# Altium schematic symbol library TI Power Management Shunt Voltage Reference.SchLib: 1526 symbols (part 16 of 18) (continued)
## TLVH431BCDBVTE4
designator U?
Low-Voltage Adjustable Precision Shunt Regulator, 80 mA, 0 to 70 degC, 5-pin SOT-23 (DBV), Green (RoHS & no Sb/Br); Manufacturer: Texas Instruments; PartNumber: TLVH431BCDBVTE4; Initial Accuracy @ 25/deg C(%): 0.5; Iout/Iz(Max)(mA): 80; Rating: Catalog; SubFamily: Shunt Voltage Reference; Temp Coeff(Max)(ppm/ degree C): 129; VO Adj(Max)(V): 18; VO Adj(Min)(V): 1.24; DatasheetVersion: SLVS555I; PackageVersion: 4073253-4/K; PackageReference: DBV5; PackageDescription: 5-Pin Plastic Small Outline, Body 1.60 ?2.90 mm, Pitch 0.95 mm; Supplier 1: Digi-Key; Supplier Part Number 1: TLVH431BCDBVTE4-ND; Supplier 2: Mouser; Supplier Part Number 2: 595-TLVH431BCDBVTE4; Eco-Plan: Green (RoHS & no Sb/Br); Min Iz for Regulation(uA): 80; Mounting Technology: Surface Mount; Code_JEDEC: MO-178; ComponentLink1Description: Manufacturer URL; ComponentLink1URL: http://www.ti.com/; ComponentLink2Description: Datasheet; ComponentLink2URL: http://www.ti.com/general/docs/lit/getliterature.tsp?genericPartNumber=TLVH431B&fileType=pdf; ComponentLink3Description: Package Specification; ComponentLink3URL: http://www.ti.com/litv/pdf/mpds018i
footprint TI-DBV5_N (SOT23, 5-Leads, Body 2.9x1.6mm, Pitch 0.95mm, IPC Medium Density)
part A pins: 3 CATHODE, 4 REF (in), 5 ANODE
part B pins: 1 NC "No internal connection", 2 NC "No internal connection"

## TLVH431BCDBVTG4
designator U?
Low-Voltage Adjustable Precision Shunt Regulator, 80 mA, 0 to 70 degC, 5-pin SOT-23 (DBV), Green (RoHS & no Sb/Br); Manufacturer: Texas Instruments; PartNumber: TLVH431BCDBVTG4; Initial Accuracy @ 25/deg C(%): 0.5; Iout/Iz(Max)(mA): 80; Rating: Catalog; SubFamily: Shunt Voltage Reference; Temp Coeff(Max)(ppm/ degree C): 129; VO Adj(Max)(V): 18; VO Adj(Min)(V): 1.24; DatasheetVersion: SLVS555I; PackageVersion: 4073253-4/K; PackageReference: DBV5; PackageDescription: 5-Pin Plastic Small Outline, Body 1.60 ?2.90 mm, Pitch 0.95 mm; Supplier 1: Digi-Key; Supplier Part Number 1: TLVH431BCDBVTG4-ND; Supplier 2: Newark; Supplier Part Number 2: 46M9033; Supplier 3: Mouser; Supplier Part Number 3: 595-TLVH431BCDBVTG4; Eco-Plan: Green (RoHS & no Sb/Br); Min Iz for Regulation(uA): 80; Mounting Technology: Surface Mount; Code_JEDEC: MO-178; ComponentLink1Description: Manufacturer URL; ComponentLink1URL: http://www.ti.com/; ComponentLink2Description: Datasheet; ComponentLink2URL: http://www.ti.com/general/docs/lit/getliterature.tsp?genericPartNumber=TLVH431B&fileType=pdf; ComponentLink3Description: Package Specification; ComponentLink3URL: http://www.ti.com/litv/pdf/mpds018i
footprint TI-DBV5_N (SOT23, 5-Leads, Body 2.9x1.6mm, Pitch 0.95mm, IPC Medium Density)
part A pins: 3 CATHODE, 4 REF (in), 5 ANODE
part B pins: 1 NC "No internal connection", 2 NC "No internal connection"

## TLVH431BCDBZR
designator U?
Low-Voltage Adjustable Precision Shunt Regulator, 80 mA, 0 to 70 degC, 3-pin SOT-23 (DBZ), Green (RoHS & no Sb/Br); Manufacturer: Texas Instruments; PartNumber: TLVH431BCDBZR; Initial Accuracy @ 25/deg C(%): 0.5; Iout/Iz(Max)(mA): 80; Rating: Catalog; SubFamily: Shunt Voltage Reference; Temp Coeff(Max)(ppm/ degree C): 129; VO Adj(Max)(V): 18; VO Adj(Min)(V): 1.24; DatasheetVersion: SLVS555I; PackageVersion: 4203227/B; PackageReference: DBZ3; PackageDescription: 3-Pin Plastic Small Outline, Body 2.92 x 1.3 mm, Pitch 0.95 mm; Supplier 1: Digi-Key; Supplier Part Number 1: 296-17685-2-ND; Supplier 2: Digi-Key; Supplier Part Number 2: 296-17685-1-ND; Supplier 3: Digi-Key; Supplier Part Number 3: 296-17685-6-ND; Supplier 4: Newark; Supplier Part Number 4: 73J8331; Supplier 5: Mouser; Supplier Part Number 5: 595-TLVH431BCDBZR; Eco-Plan: Green (RoHS & no Sb/Br); Min Iz for Regulation(uA): 80; Mounting Technology: Surface Mount; Code_JEDEC: TO-236; ComponentLink1Description: Manufacturer URL; ComponentLink1URL: http://www.ti.com/; ComponentLink2Description: Datasheet; ComponentLink2URL: http://www.ti.com/general/docs/lit/getliterature.tsp?genericPartNumber=TLVH431B&fileType=pdf; ComponentLink3Description: Package Specification; ComponentLink3URL: http://www.ti.com/litv/pdf/mpds108a
footprint TI-DBZ3_N (SOT23, 3-Leads, Body 2.92x1.3 mm, Pitch 0.95 mm, IPC Medium Density)
pins: 1 REF (in), 2 CATHODE, 3 ANODE

## TLVH431BCDBZRG4
designator U?
Low-Voltage Adjustable Precision Shunt Regulator, 80 mA, 0 to 70 degC, 3-pin SOT-23 (DBZ), Green (RoHS & no Sb/Br); Manufacturer: Texas Instruments; PartNumber: TLVH431BCDBZRG4; Initial Accuracy @ 25/deg C(%): 0.5; Iout/Iz(Max)(mA): 80; Rating: Catalog; SubFamily: Shunt Voltage Reference; Temp Coeff(Max)(ppm/ degree C): 129; VO Adj(Max)(V): 18; VO Adj(Min)(V): 1.24; DatasheetVersion: SLVS555I; PackageVersion: 4203227/B; PackageReference: DBZ3; PackageDescription: 3-Pin Plastic Small Outline, Body 2.92 x 1.3 mm, Pitch 0.95 mm; Supplier 1: Digi-Key; Supplier Part Number 1: TLVH431BCDBZRG4-ND; Supplier 2: Mouser; Supplier Part Number 2: 595-TLVH431BCDBZRG4; Eco-Plan: Green (RoHS & no Sb/Br); Min Iz for Regulation(uA): 80; Mounting Technology: Surface Mount; Code_JEDEC: TO-236; ComponentLink1Description: Manufacturer URL; ComponentLink1URL: http://www.ti.com/; ComponentLink2Description: Datasheet; ComponentLink2URL: http://www.ti.com/general/docs/lit/getliterature.tsp?genericPartNumber=TLVH431B&fileType=pdf; ComponentLink3Description: Package Specification; ComponentLink3URL: http://www.ti.com/litv/pdf/mpds108a
footprint TI-DBZ3_N (SOT23, 3-Leads, Body 2.92x1.3 mm, Pitch 0.95 mm, IPC Medium Density)
pins: 1 REF (in), 2 CATHODE, 3 ANODE

## TLVH431BCDBZT
designator U?
Low-Voltage Adjustable Precision Shunt Regulator, 80 mA, 0 to 70 degC, 3-pin SOT-23 (DBZ), Green (RoHS & no Sb/Br); Manufacturer: Texas Instruments; PartNumber: TLVH431BCDBZT; Initial Accuracy @ 25/deg C(%): 0.5; Iout/Iz(Max)(mA): 80; Rating: Catalog; SubFamily: Shunt Voltage Reference; Temp Coeff(Max)(ppm/ degree C): 129; VO Adj(Max)(V): 18; VO Adj(Min)(V): 1.24; DatasheetVersion: SLVS555I; PackageVersion: 4203227/B; PackageReference: DBZ3; PackageDescription: 3-Pin Plastic Small Outline, Body 2.92 x 1.3 mm, Pitch 0.95 mm; Supplier 1: Digi-Key; Supplier Part Number 1: 296-32429-2-ND; Supplier 2: Digi-Key; Supplier Part Number 2: 296-32429-1-ND; Supplier 3: Digi-Key; Supplier Part Number 3: 296-32429-6-ND; Supplier 4: Mouser; Supplier Part Number 4: 595-TLVH431BCDBZT; Eco-Plan: Green (RoHS & no Sb/Br); Min Iz for Regulation(uA): 80; Mounting Technology: Surface Mount; Code_JEDEC: TO-236; ComponentLink1Description: Manufacturer URL; ComponentLink1URL: http://www.ti.com/; ComponentLink2Description: Datasheet; ComponentLink2URL: http://www.ti.com/general/docs/lit/getliterature.tsp?genericPartNumber=TLVH431B&fileType=pdf; ComponentLink3Description: Package Specification; ComponentLink3URL: http://www.ti.com/litv/pdf/mpds108a
footprint TI-DBZ3_N (SOT23, 3-Leads, Body 2.92x1.3 mm, Pitch 0.95 mm, IPC Medium Density)
pins: 1 REF (in), 2 CATHODE, 3 ANODE

## TLVH431BCDBZTG4
designator U?
Low-Voltage Adjustable Precision Shunt Regulator, 80 mA, 0 to 70 degC, 3-pin SOT-23 (DBZ), Green (RoHS & no Sb/Br); Manufacturer: Texas Instruments; PartNumber: TLVH431BCDBZTG4; Initial Accuracy @ 25/deg C(%): 0.5; Iout/Iz(Max)(mA): 80; Rating: Catalog; SubFamily: Shunt Voltage Reference; Temp Coeff(Max)(ppm/ degree C): 129; VO Adj(Max)(V): 18; VO Adj(Min)(V): 1.24; DatasheetVersion: SLVS555I; PackageVersion: 4203227/B; PackageReference: DBZ3; PackageDescription: 3-Pin Plastic Small Outline, Body 2.92 x 1.3 mm, Pitch 0.95 mm; Supplier 1: Digi-Key; Supplier Part Number 1: TLVH431BCDBZTG4-ND; Supplier 2: Farnell; Supplier Part Number 2: 1053329; Supplier 3: Newark; Supplier Part Number 3: 98K1597; Supplier 4: Mouser; Supplier Part Number 4: 595-TLVH431BCDBZTG4; Eco-Plan: Green (RoHS & no Sb/Br); Min Iz for Regulation(uA): 80; Mounting Technology: Surface Mount; Code_JEDEC: TO-236; ComponentLink1Description: Manufacturer URL; ComponentLink1URL: http://www.ti.com/; ComponentLink2Description: Datasheet; ComponentLink2URL: http://www.ti.com/general/docs/lit/getliterature.tsp?genericPartNumber=TLVH431B&fileType=pdf; ComponentLink3Description: Package Specification; ComponentLink3URL: http://www.ti.com/litv/pdf/mpds108a
footprint TI-DBZ3_N (SOT23, 3-Leads, Body 2.92x1.3 mm, Pitch 0.95 mm, IPC Medium Density)
pins: 1 REF (in), 2 CATHODE, 3 ANODE

## TLVH431BCDCKR
designator U?
Low-Voltage Adjustable Precision Shunt Regulator, 80 mA, 0 to 70 degC, 6-pin SC70 (DCK), Green (RoHS & no Sb/Br); Manufacturer: Texas Instruments; PartNumber: TLVH431BCDCKR; Initial Accuracy @ 25/deg C(%): 0.5; Iout/Iz(Max)(mA): 80; Rating: Catalog; SubFamily: Shunt Voltage Reference; Temp Coeff(Max)(ppm/ degree C): 129; VO Adj(Max)(V): 18; VO Adj(Min)(V): 1.24; DatasheetVersion: SLVS555I; PackageReference: DCK6; PackageDescription: 6-Pin Plastic Small Outline, Body 2 x 1.25 mm, 0.65 mm Pitch, 2.1 mm Lead Span; Supplier 1: Digi-Key; Supplier Part Number 1: 296-17797-2-ND; Supplier 2: Digi-Key; Supplier Part Number 2: 296-17797-1-ND; Supplier 3: Digi-Key; Supplier Part Number 3: 296-17797-6-ND; Supplier 4: Mouser; Supplier Part Number 4: 595-TLVH431BCDCKR; Eco-Plan: Green (RoHS & no Sb/Br); Min Iz for Regulation(uA): 80; Mounting Technology: Surface Mount; Code_JEDEC: MO-203; ComponentLink1Description: Manufacturer URL; ComponentLink1URL: http://www.ti.com/; ComponentLink2Description: Datasheet; ComponentLink2URL: http://www.ti.com/general/docs/lit/getliterature.tsp?genericPartNumber=TLVH431B&fileType=pdf; ComponentLink3Description: Package Specification; ComponentLink3URL: http://www.ti.com/litv/pdf/mpds114c
footprint TI-DCK6_V (SOT23, 6-Leads, Body 2x1.25mm, Pitch 0.65mm)
part A pins: 1 CATHODE, 3 REF (in), 6 ANODE
part B pins: 2 NC "No internal connection", 4 NC "No internal connection", 5 NC "No internal connection"

## TLVH431BCDCKRE4
designator U?
Low-Voltage Adjustable Precision Shunt Regulator, 80 mA, 0 to 70 degC, 6-pin SC70 (DCK), Green (RoHS & no Sb/Br); Manufacturer: Texas Instruments; PartNumber: TLVH431BCDCKRE4; Initial Accuracy @ 25/deg C(%): 0.5; Iout/Iz(Max)(mA): 80; Rating: Catalog; SubFamily: Shunt Voltage Reference; Temp Coeff(Max)(ppm/ degree C): 129; VO Adj(Max)(V): 18; VO Adj(Min)(V): 1.24; DatasheetVersion: SLVS555I; PackageReference: DCK6; PackageDescription: 6-Pin Plastic Small Outline, Body 2 x 1.25 mm, 0.65 mm Pitch, 2.1 mm Lead Span; Supplier 1: Digi-Key; Supplier Part Number 1: TLVH431BCDCKRE4-ND; Supplier 2: Newark; Supplier Part Number 2: 37K4203; Supplier 3: Mouser; Supplier Part Number 3: 595-TLVH431BCDCKRE4; Eco-Plan: Green (RoHS & no Sb/Br); Min Iz for Regulation(uA): 80; Mounting Technology: Surface Mount; Code_JEDEC: MO-203; ComponentLink1Description: Manufacturer URL; ComponentLink1URL: http://www.ti.com/; ComponentLink2Description: Datasheet; ComponentLink2URL: http://www.ti.com/general/docs/lit/getliterature.tsp?genericPartNumber=TLVH431B&fileType=pdf; ComponentLink3Description: Package Specification; ComponentLink3URL: http://www.ti.com/litv/pdf/mpds114c; ComponentLink4Description: URL Link1; ComponentLink4URL: Samples URL:http://www.ti.com/lit/ds/symlink/tlvh432.pdf
footprint TI-DCK6_V (SOT23, 6-Leads, Body 2x1.25mm, Pitch 0.65mm)
part A pins: 1 CATHODE, 3 REF (in), 6 ANODE
part B pins: 2 NC "No internal connection", 4 NC "No internal connection", 5 NC "No internal connection"

## TLVH431BCDCKRG4
designator U?
Low-Voltage Adjustable Precision Shunt Regulator, 80 mA, 0 to 70 degC, 6-pin SC70 (DCK), Green (RoHS & no Sb/Br); Manufacturer: Texas Instruments; PartNumber: TLVH431BCDCKRG4; Initial Accuracy @ 25/deg C(%): 0.5; Iout/Iz(Max)(mA): 80; Rating: Catalog; SubFamily: Shunt Voltage Reference; Temp Coeff(Max)(ppm/ degree C): 129; VO Adj(Max)(V): 18; VO Adj(Min)(V): 1.24; DatasheetVersion: SLVS555I; PackageReference: DCK6; PackageDescription: 6-Pin Plastic Small Outline, Body 2 x 1.25 mm, 0.65 mm Pitch, 2.1 mm Lead Span; Supplier 1: Digi-Key; Supplier Part Number 1: TLVH431BCDCKRG4-ND; Supplier 2: Newark; Supplier Part Number 2: 41M5448; Supplier 3: Mouser; Supplier Part Number 3: 595-TLVH431BCDCKRG4; Eco-Plan: Green (RoHS & no Sb/Br); Min Iz for Regulation(uA): 80; Mounting Technology: Surface Mount; Code_JEDEC: MO-203; ComponentLink1Description: Manufacturer URL; ComponentLink1URL: http://www.ti.com/; ComponentLink2Description: Datasheet; ComponentLink2URL: http://www.ti.com/general/docs/lit/getliterature.tsp?genericPartNumber=TLVH431B&fileType=pdf; ComponentLink3Description: Package Specification; ComponentLink3URL: http://www.ti.com/litv/pdf/mpds114c; ComponentLink4Description: URL Link1; ComponentLink4URL: Samples URL:http://www.ti.com/lit/ds/symlink/tlvh432.pdf
footprint TI-DCK6_V (SOT23, 6-Leads, Body 2x1.25mm, Pitch 0.65mm)
part A pins: 1 CATHODE, 3 REF (in), 6 ANODE
part B pins: 2 NC "No internal connection", 4 NC "No internal connection", 5 NC "No internal connection"

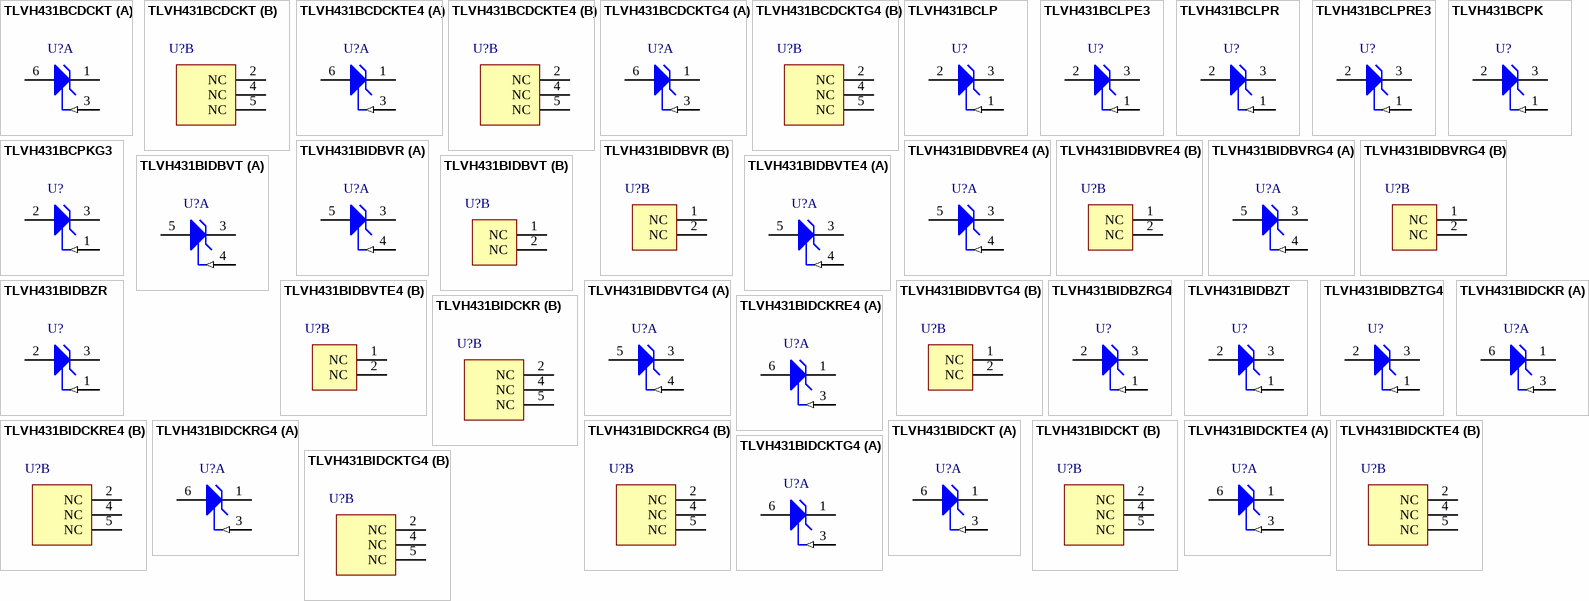
[diagram p51: symbols TLVH431BCDCKT to TLVH431BIDCKTG4]

## TLVH431BCDCKT
designator U?
Low-Voltage Adjustable Precision Shunt Regulator, 80 mA, 0 to 70 degC, 6-pin SC70 (DCK), Green (RoHS & no Sb/Br); Manufacturer: Texas Instruments; PartNumber: TLVH431BCDCKT; Initial Accuracy @ 25/deg C(%): 0.5; Iout/Iz(Max)(mA): 80; Rating: Catalog; SubFamily: Shunt Voltage Reference; Temp Coeff(Max)(ppm/ degree C): 129; VO Adj(Max)(V): 18; VO Adj(Min)(V): 1.24; DatasheetVersion: SLVS555I; PackageReference: DCK6; PackageDescription: 6-Pin Plastic Small Outline, Body 2 x 1.25 mm, 0.65 mm Pitch, 2.1 mm Lead Span; Supplier 1: Digi-Key; Supplier Part Number 1: 296-32430-2-ND; Supplier 2: Digi-Key; Supplier Part Number 2: 296-32430-1-ND; Supplier 3: Digi-Key; Supplier Part Number 3: 296-32430-6-ND; Supplier 4: Mouser; Supplier Part Number 4: 595-TLVH431BCDCKT; Eco-Plan: Green (RoHS & no Sb/Br); Min Iz for Regulation(uA): 80; Mounting Technology: Surface Mount; Code_JEDEC: MO-203; ComponentLink1Description: Manufacturer URL; ComponentLink1URL: http://www.ti.com/; ComponentLink2Description: Datasheet; ComponentLink2URL: http://www.ti.com/general/docs/lit/getliterature.tsp?genericPartNumber=TLVH431B&fileType=pdf; ComponentLink3Description: Package Specification; ComponentLink3URL: http://www.ti.com/litv/pdf/mpds114c; ComponentLink4Description: URL Link1; ComponentLink4URL: Samples URL:http://www.ti.com/lit/ds/symlink/tlvh432.pdf
footprint TI-DCK6_V (SOT23, 6-Leads, Body 2x1.25mm, Pitch 0.65mm)
part A pins: 1 CATHODE, 3 REF (in), 6 ANODE
part B pins: 2 NC "No internal connection", 4 NC "No internal connection", 5 NC "No internal connection"

## TLVH431BCDCKTE4
designator U?
Low-Voltage Adjustable Precision Shunt Regulator, 80 mA, 0 to 70 degC, 6-pin SC70 (DCK), Green (RoHS & no Sb/Br); Manufacturer: Texas Instruments; PartNumber: TLVH431BCDCKTE4; Initial Accuracy @ 25/deg C(%): 0.5; Iout/Iz(Max)(mA): 80; Rating: Catalog; SubFamily: Shunt Voltage Reference; Temp Coeff(Max)(ppm/ degree C): 129; VO Adj(Max)(V): 18; VO Adj(Min)(V): 1.24; DatasheetVersion: SLVS555I; PackageReference: DCK6; PackageDescription: 6-Pin Plastic Small Outline, Body 2 x 1.25 mm, 0.65 mm Pitch, 2.1 mm Lead Span; Supplier 1: Digi-Key; Supplier Part Number 1: TLVH431BCDCKTE4-ND; Supplier 2: Mouser; Supplier Part Number 2: 595-TLVH431BCDCKTE4; Eco-Plan: Green (RoHS & no Sb/Br); Min Iz for Regulation(uA): 80; Mounting Technology: Surface Mount; Code_JEDEC: MO-203; ComponentLink1Description: Manufacturer URL; ComponentLink1URL: http://www.ti.com/; ComponentLink2Description: Datasheet; ComponentLink2URL: http://www.ti.com/general/docs/lit/getliterature.tsp?genericPartNumber=TLVH431B&fileType=pdf; ComponentLink3Description: Package Specification; ComponentLink3URL: http://www.ti.com/litv/pdf/mpds114c; ComponentLink4Description: URL Link1; ComponentLink4URL: Samples URL:http://www.ti.com/lit/ds/symlink/tlvh432.pdf
footprint TI-DCK6_V (SOT23, 6-Leads, Body 2x1.25mm, Pitch 0.65mm)
part A pins: 1 CATHODE, 3 REF (in), 6 ANODE
part B pins: 2 NC "No internal connection", 4 NC "No internal connection", 5 NC "No internal connection"

## TLVH431BCDCKTG4
designator U?
Low-Voltage Adjustable Precision Shunt Regulator, 80 mA, 0 to 70 degC, 6-pin SC70 (DCK), Green (RoHS & no Sb/Br); Manufacturer: Texas Instruments; PartNumber: TLVH431BCDCKTG4; Initial Accuracy @ 25/deg C(%): 0.5; Iout/Iz(Max)(mA): 80; Rating: Catalog; SubFamily: Shunt Voltage Reference; Temp Coeff(Max)(ppm/ degree C): 129; VO Adj(Max)(V): 18; VO Adj(Min)(V): 1.24; DatasheetVersion: SLVS555I; PackageReference: DCK6; PackageDescription: 6-Pin Plastic Small Outline, Body 2 x 1.25 mm, 0.65 mm Pitch, 2.1 mm Lead Span; Supplier 1: Digi-Key; Supplier Part Number 1: TLVH431BCDCKTG4-ND; Supplier 2: Newark; Supplier Part Number 2: 41M5449; Supplier 3: Mouser; Supplier Part Number 3: 595-TLVH431BCDCKTG4; Eco-Plan: Green (RoHS & no Sb/Br); Min Iz for Regulation(uA): 80; Mounting Technology: Surface Mount; Code_JEDEC: MO-203; ComponentLink1Description: Manufacturer URL; ComponentLink1URL: http://www.ti.com/; ComponentLink2Description: Datasheet; ComponentLink2URL: http://www.ti.com/general/docs/lit/getliterature.tsp?genericPartNumber=TLVH431B&fileType=pdf; ComponentLink3Description: Package Specification; ComponentLink3URL: http://www.ti.com/litv/pdf/mpds114c
footprint TI-DCK6_V (SOT23, 6-Leads, Body 2x1.25mm, Pitch 0.65mm)
part A pins: 1 CATHODE, 3 REF (in), 6 ANODE
part B pins: 2 NC "No internal connection", 4 NC "No internal connection", 5 NC "No internal connection"

## TLVH431BCLP
designator U?
Low-Voltage Adjustable Precision Shunt Regulator, 80 mA, 0 to 70 degC, 3-pin TO-92 (LP), Pb-Free (RoHS); Manufacturer: Texas Instruments; PartNumber: TLVH431BCLP; Initial Accuracy @ 25/deg C(%): 0.5; Iout/Iz(Max)(mA): 80; Rating: Catalog; SubFamily: Shunt Voltage Reference; Temp Coeff(Max)(ppm/ degree C): 129; VO Adj(Max)(V): 18; VO Adj(Min)(V): 1.24; DatasheetVersion: SLVS555I; PackageVersion: 4040001-2/C; PackageReference: LP3; PackageDescription: Plastic Cylindrical Package, Formed Lead Option (TO-92); Supplier 1: Digi-Key; Supplier Part Number 1: 296-31401-ND; Supplier 2: Mouser; Supplier Part Number 2: 595-TLVH431BCLP; Eco-Plan: Pb-Free (RoHS); Min Iz for Regulation(uA): 80; Mounting Technology: Through Hole; Code_JEDEC: TO-226; ComponentLink1Description: Manufacturer URL; ComponentLink1URL: http://www.ti.com/; ComponentLink2Description: Datasheet; ComponentLink2URL: http://www.ti.com/general/docs/lit/getliterature.tsp?genericPartNumber=TLVH431B&fileType=pdf; ComponentLink3Description: Package Specification; ComponentLink3URL: http://www.ti.com/litv/pdf/msot002a; ComponentLink4Description: URL Link1; ComponentLink4URL: Samples URL:http://www.ti.com/lit/ds/symlink/tlvh432.pdf
footprint TI-LP3 (TO, Flat Index; 3 In-Line, Formed Axial Leads; Body Dia. 4.8mm; Leads 0.56 x 0.41 mm (max))
pins: 1 REF (in), 2 ANODE, 3 CATHODE

## TLVH431BCLPE3
designator U?
Low-Voltage Adjustable Precision Shunt Regulator, 80 mA, 0 to 70 degC, 3-pin TO-92 (LP), Pb-Free (RoHS); Manufacturer: Texas Instruments; PartNumber: TLVH431BCLPE3; Initial Accuracy @ 25/deg C(%): 0.5; Iout/Iz(Max)(mA): 80; Rating: Catalog; SubFamily: Shunt Voltage Reference; Temp Coeff(Max)(ppm/ degree C): 129; VO Adj(Max)(V): 18; VO Adj(Min)(V): 1.24; DatasheetVersion: SLVS555I; PackageVersion: 4040001-2/C; PackageReference: LP3; PackageDescription: Plastic Cylindrical Package, Formed Lead Option (TO-92); Supplier 1: Digi-Key; Supplier Part Number 1: TLVH431BCLPE3-ND; Supplier 2: Mouser; Supplier Part Number 2: 595-TLVH431BCLPE3; Eco-Plan: Pb-Free (RoHS); Min Iz for Regulation(uA): 80; Mounting Technology: Through Hole; Code_JEDEC: TO-226; ComponentLink1Description: Manufacturer URL; ComponentLink1URL: http://www.ti.com/; ComponentLink2Description: Datasheet; ComponentLink2URL: http://www.ti.com/general/docs/lit/getliterature.tsp?genericPartNumber=TLVH431B&fileType=pdf; ComponentLink3Description: Package Specification; ComponentLink3URL: http://www.ti.com/litv/pdf/msot002a; ComponentLink4Description: URL Link1; ComponentLink4URL: Samples URL:http://www.ti.com/lit/ds/symlink/tlvh432.pdf
footprint TI-LP3 (TO, Flat Index; 3 In-Line, Formed Axial Leads; Body Dia. 4.8mm; Leads 0.56 x 0.41 mm (max))
pins: 1 REF (in), 2 ANODE, 3 CATHODE

## TLVH431BCLPR
designator U?
Low-Voltage Adjustable Precision Shunt Regulator, 80 mA, 0 to 70 degC, 3-pin TO-92 (LP), Pb-Free (RoHS); Manufacturer: Texas Instruments; PartNumber: TLVH431BCLPR; Initial Accuracy @ 25/deg C(%): 0.5; Iout/Iz(Max)(mA): 80; Rating: Catalog; SubFamily: Shunt Voltage Reference; Temp Coeff(Max)(ppm/ degree C): 129; VO Adj(Max)(V): 18; VO Adj(Min)(V): 1.24; DatasheetVersion: SLVS555I; PackageVersion: 4040001-2/C; PackageReference: LP3; PackageDescription: Plastic Cylindrical Package, Formed Lead Option (TO-92); Supplier 1: Digi-Key; Supplier Part Number 1: 296-17812-2-ND; Supplier 2: Digi-Key; Supplier Part Number 2: 296-17812-1-ND; Supplier 3: Newark; Supplier Part Number 3: 24K5433; Supplier 4: Mouser; Supplier Part Number 4: 595-TLVH431BCLPR; Eco-Plan: Pb-Free (RoHS); Min Iz for Regulation(uA): 80; Mounting Technology: Through Hole; Code_JEDEC: TO-226; ComponentLink1Description: Manufacturer URL; ComponentLink1URL: http://www.ti.com/; ComponentLink2Description: Datasheet; ComponentLink2URL: http://www.ti.com/general/docs/lit/getliterature.tsp?genericPartNumber=TLVH431B&fileType=pdf; ComponentLink3Description: Package Specification; ComponentLink3URL: http://www.ti.com/litv/pdf/msot002a; ComponentLink4Description: URL Link1; ComponentLink4URL: Samples URL:http://www.ti.com/lit/ds/symlink/tlvh432.pdf
footprint TI-LP3 (TO, Flat Index; 3 In-Line, Formed Axial Leads; Body Dia. 4.8mm; Leads 0.56 x 0.41 mm (max))
pins: 1 REF (in), 2 ANODE, 3 CATHODE

## TLVH431BCLPRE3
designator U?
Low-Voltage Adjustable Precision Shunt Regulator, 80 mA, 0 to 70 degC, 3-pin TO-92 (LP), Pb-Free (RoHS); Manufacturer: Texas Instruments; PartNumber: TLVH431BCLPRE3; Initial Accuracy @ 25/deg C(%): 0.5; Iout/Iz(Max)(mA): 80; Rating: Catalog; SubFamily: Shunt Voltage Reference; Temp Coeff(Max)(ppm/ degree C): 129; VO Adj(Max)(V): 18; VO Adj(Min)(V): 1.24; DatasheetVersion: SLVS555I; PackageVersion: 4040001-2/C; PackageReference: LP3; PackageDescription: Plastic Cylindrical Package, Formed Lead Option (TO-92); Supplier 1: Digi-Key; Supplier Part Number 1: TLVH431BCLPRE3-ND; Supplier 2: Mouser; Supplier Part Number 2: 595-TLVH431BCLPRE3; Eco-Plan: Pb-Free (RoHS); Min Iz for Regulation(uA): 80; Mounting Technology: Through Hole; Code_JEDEC: TO-226; ComponentLink1Description: Manufacturer URL; ComponentLink1URL: http://www.ti.com/; ComponentLink2Description: Datasheet; ComponentLink2URL: http://www.ti.com/general/docs/lit/getliterature.tsp?genericPartNumber=TLVH431B&fileType=pdf; ComponentLink3Description: Package Specification; ComponentLink3URL: http://www.ti.com/litv/pdf/msot002a; ComponentLink4Description: URL Link1; ComponentLink4URL: Samples URL:http://www.ti.com/lit/ds/symlink/tlvh432.pdf
footprint TI-LP3 (TO, Flat Index; 3 In-Line, Formed Axial Leads; Body Dia. 4.8mm; Leads 0.56 x 0.41 mm (max))
pins: 1 REF (in), 2 ANODE, 3 CATHODE

## TLVH431BCPK
designator U?
Low-Voltage Adjustable Precision Shunt Regulator, 80 mA, 0 to 70 degC, 3-pin SOT-89 (PK), Green (RoHS & no Sb/Br); Manufacturer: Texas Instruments; PartNumber: TLVH431BCPK; Initial Accuracy @ 25/deg C(%): 0.5; Iout/Iz(Max)(mA): 80; Rating: Catalog; SubFamily: Shunt Voltage Reference; Temp Coeff(Max)(ppm/ degree C): 129; VO Adj(Max)(V): 18; VO Adj(Min)(V): 1.24; DatasheetVersion: SLVS555I; PackageVersion: 4040234/D; PackageReference: PK3; PackageDescription: 3-Pin Plastic Small Outline, Body 2.5 x 4.5 mm, Pitch 1.5 mm; Supplier 1: Digi-Key; Supplier Part Number 1: 296-18622-2-ND; Supplier 2: Digi-Key; Supplier Part Number 2: 296-18622-1-ND; Supplier 3: Digi-Key; Supplier Part Number 3: 296-18622-6-ND; Supplier 4: Newark; Supplier Part Number 4: 57K1241; Supplier 5: Mouser; Supplier Part Number 5: 595-TLVH431BCPK; Eco-Plan: Green (RoHS & no Sb/Br); Min Iz for Regulation(uA): 80; Mounting Technology: Surface Mount; Code_JEDEC: TO-243; ComponentLink1Description: Manufacturer URL; ComponentLink1URL: http://www.ti.com/; ComponentLink2Description: Datasheet; ComponentLink2URL: http://www.ti.com/general/docs/lit/getliterature.tsp?genericPartNumber=TLVH431B&fileType=pdf; ComponentLink3Description: Package Specification; ComponentLink3URL: http://www.ti.com/litv/pdf/mhsi001b; ComponentLink4Description: URL Link1; ComponentLink4URL: Samples URL:http://www.ti.com/lit/ds/symlink/tlvh432.pdf
footprint TI-PK3_N (SOT89, 3-Leads, Body 4.5x2.5mm, Pitch 1.5mm, IPC Medium Density)
pins: 1 REF (in), 2 ANODE, 3 CATHODE

## TLVH431BCPKG3
designator U?
Low-Voltage Adjustable Precision Shunt Regulator, 80 mA, 0 to 70 degC, 3-pin SOT-89 (PK), Green (RoHS & no Sb/Br); Manufacturer: Texas Instruments; PartNumber: TLVH431BCPKG3; Initial Accuracy @ 25/deg C(%): 0.5; Iout/Iz(Max)(mA): 80; Rating: Catalog; SubFamily: Shunt Voltage Reference; Temp Coeff(Max)(ppm/ degree C): 129; VO Adj(Max)(V): 18; VO Adj(Min)(V): 1.24; DatasheetVersion: SLVS555I; PackageVersion: 4040234/D; PackageReference: PK3; PackageDescription: 3-Pin Plastic Small Outline, Body 2.5 x 4.5 mm, Pitch 1.5 mm; Supplier 1: Digi-Key; Supplier Part Number 1: 296-19345-2-ND; Supplier 2: Digi-Key; Supplier Part Number 2: 296-19345-1-ND; Supplier 3: Digi-Key; Supplier Part Number 3: 296-19345-6-ND; Supplier 4: Mouser; Supplier Part Number 4: 595-TLVH431BCPKG3; Eco-Plan: Green (RoHS & no Sb/Br); Min Iz for Regulation(uA): 80; Mounting Technology: Surface Mount; Code_JEDEC: TO-243; ComponentLink1Description: Manufacturer URL; ComponentLink1URL: http://www.ti.com/; ComponentLink2Description: Datasheet; ComponentLink2URL: http://www.ti.com/general/docs/lit/getliterature.tsp?genericPartNumber=TLVH431B&fileType=pdf; ComponentLink3Description: Package Specification; ComponentLink3URL: http://www.ti.com/litv/pdf/mhsi001b
footprint TI-PK3_N (SOT89, 3-Leads, Body 4.5x2.5mm, Pitch 1.5mm, IPC Medium Density)
pins: 1 REF (in), 2 ANODE, 3 CATHODE

## TLVH431BIDBVR
designator U?
Low-Voltage Adjustable Precision Shunt Regulator, 80 mA, -40 to 85 degC, 5-pin SOT-23 (DBV), Green (RoHS & no Sb/Br); Manufacturer: Texas Instruments; PartNumber: TLVH431BIDBVR; Initial Accuracy @ 25/deg C(%): 0.5; Iout/Iz(Max)(mA): 80; Rating: Catalog; SubFamily: Shunt Voltage Reference; Temp Coeff(Max)(ppm/ degree C): 129; VO Adj(Max)(V): 18; VO Adj(Min)(V): 1.24; DatasheetVersion: SLVS555I; PackageVersion: 4073253-4/K; PackageReference: DBV5; PackageDescription: 5-Pin Plastic Small Outline, Body 1.60 ?2.90 mm, Pitch 0.95 mm; Supplier 1: Digi-Key; Supplier Part Number 1: 296-17686-2-ND; Supplier 2: Digi-Key; Supplier Part Number 2: 296-17686-1-ND; Supplier 3: Digi-Key; Supplier Part Number 3: 296-17686-6-ND; Supplier 4: Newark; Supplier Part Number 4: 73J8333; Supplier 5: Mouser; Supplier Part Number 5: 595-TLVH431BIDBVR; Eco-Plan: Green (RoHS & no Sb/Br); Min Iz for Regulation(uA): 80; Mounting Technology: Surface Mount; Code_JEDEC: MO-178; ComponentLink1Description: Manufacturer URL; ComponentLink1URL: http://www.ti.com/; ComponentLink2Description: Datasheet; ComponentLink2URL: http://www.ti.com/general/docs/lit/getliterature.tsp?genericPartNumber=TLVH431B&fileType=pdf; ComponentLink3Description: Package Specification; ComponentLink3URL: http://www.ti.com/litv/pdf/mpds018i
footprint TI-DBV5_N (SOT23, 5-Leads, Body 2.9x1.6mm, Pitch 0.95mm, IPC Medium Density)
part A pins: 3 CATHODE, 4 REF (in), 5 ANODE
part B pins: 1 NC "No internal connection", 2 NC "No internal connection"

## TLVH431BIDBVRE4
designator U?
Low-Voltage Adjustable Precision Shunt Regulator, 80 mA, -40 to 85 degC, 5-pin SOT-23 (DBV), Green (RoHS & no Sb/Br); Manufacturer: Texas Instruments; PartNumber: TLVH431BIDBVRE4; Initial Accuracy @ 25/deg C(%): 0.5; Iout/Iz(Max)(mA): 80; Rating: Catalog; SubFamily: Shunt Voltage Reference; Temp Coeff(Max)(ppm/ degree C): 129; VO Adj(Max)(V): 18; VO Adj(Min)(V): 1.24; DatasheetVersion: SLVS555I; PackageVersion: 4073253-4/K; PackageReference: DBV5; PackageDescription: 5-Pin Plastic Small Outline, Body 1.60 ?2.90 mm, Pitch 0.95 mm; Supplier 1: Digi-Key; Supplier Part Number 1: TLVH431BIDBVRE4-ND; Supplier 2: Mouser; Supplier Part Number 2: 595-TLVH431BIDBVRE4; Eco-Plan: Green (RoHS & no Sb/Br); Min Iz for Regulation(uA): 80; Mounting Technology: Surface Mount; Code_JEDEC: MO-178; ComponentLink1Description: Manufacturer URL; ComponentLink1URL: http://www.ti.com/; ComponentLink2Description: Datasheet; ComponentLink2URL: http://www.ti.com/general/docs/lit/getliterature.tsp?genericPartNumber=TLVH431B&fileType=pdf; ComponentLink3Description: Package Specification; ComponentLink3URL: http://www.ti.com/litv/pdf/mpds018i
footprint TI-DBV5_N (SOT23, 5-Leads, Body 2.9x1.6mm, Pitch 0.95mm, IPC Medium Density)
part A pins: 3 CATHODE, 4 REF (in), 5 ANODE
part B pins: 1 NC "No internal connection", 2 NC "No internal connection"

## TLVH431BIDBVRG4
designator U?
Low-Voltage Adjustable Precision Shunt Regulator, 80 mA, -40 to 85 degC, 5-pin SOT-23 (DBV), Green (RoHS & no Sb/Br); Manufacturer: Texas Instruments; PartNumber: TLVH431BIDBVRG4; Initial Accuracy @ 25/deg C(%): 0.5; Iout/Iz(Max)(mA): 80; Rating: Catalog; SubFamily: Shunt Voltage Reference; Temp Coeff(Max)(ppm/ degree C): 129; VO Adj(Max)(V): 18; VO Adj(Min)(V): 1.24; DatasheetVersion: SLVS555I; PackageVersion: 4073253-4/K; PackageReference: DBV5; PackageDescription: 5-Pin Plastic Small Outline, Body 1.60 ?2.90 mm, Pitch 0.95 mm; Supplier 1: Digi-Key; Supplier Part Number 1: TLVH431BIDBVRG4-ND; Supplier 2: Newark; Supplier Part Number 2: 46M9034; Supplier 3: Mouser; Supplier Part Number 3: 595-TLVH431BIDBVRG4; Eco-Plan: Green (RoHS & no Sb/Br); Min Iz for Regulation(uA): 80; Mounting Technology: Surface Mount; Code_JEDEC: MO-178; ComponentLink1Description: Manufacturer URL; ComponentLink1URL: http://www.ti.com/; ComponentLink2Description: Datasheet; ComponentLink2URL: http://www.ti.com/general/docs/lit/getliterature.tsp?genericPartNumber=TLVH431B&fileType=pdf; ComponentLink3Description: Package Specification; ComponentLink3URL: http://www.ti.com/litv/pdf/mpds018i
footprint TI-DBV5_N (SOT23, 5-Leads, Body 2.9x1.6mm, Pitch 0.95mm, IPC Medium Density)
part A pins: 3 CATHODE, 4 REF (in), 5 ANODE
part B pins: 1 NC "No internal connection", 2 NC "No internal connection"
